# Altium footprint library SINA.PcbLib: 103 footprints (part 6 of 7)
Each footprint in its own frame and in the unit in brackets; x right, y up, seen from the top. Pads: shape width x height; smd on the part's side, far side on the other; paste and mask are expansions set on the pad; w line width, h text height; cw(c..) or ccw(c..) is an arc to the next point about the centre after c.
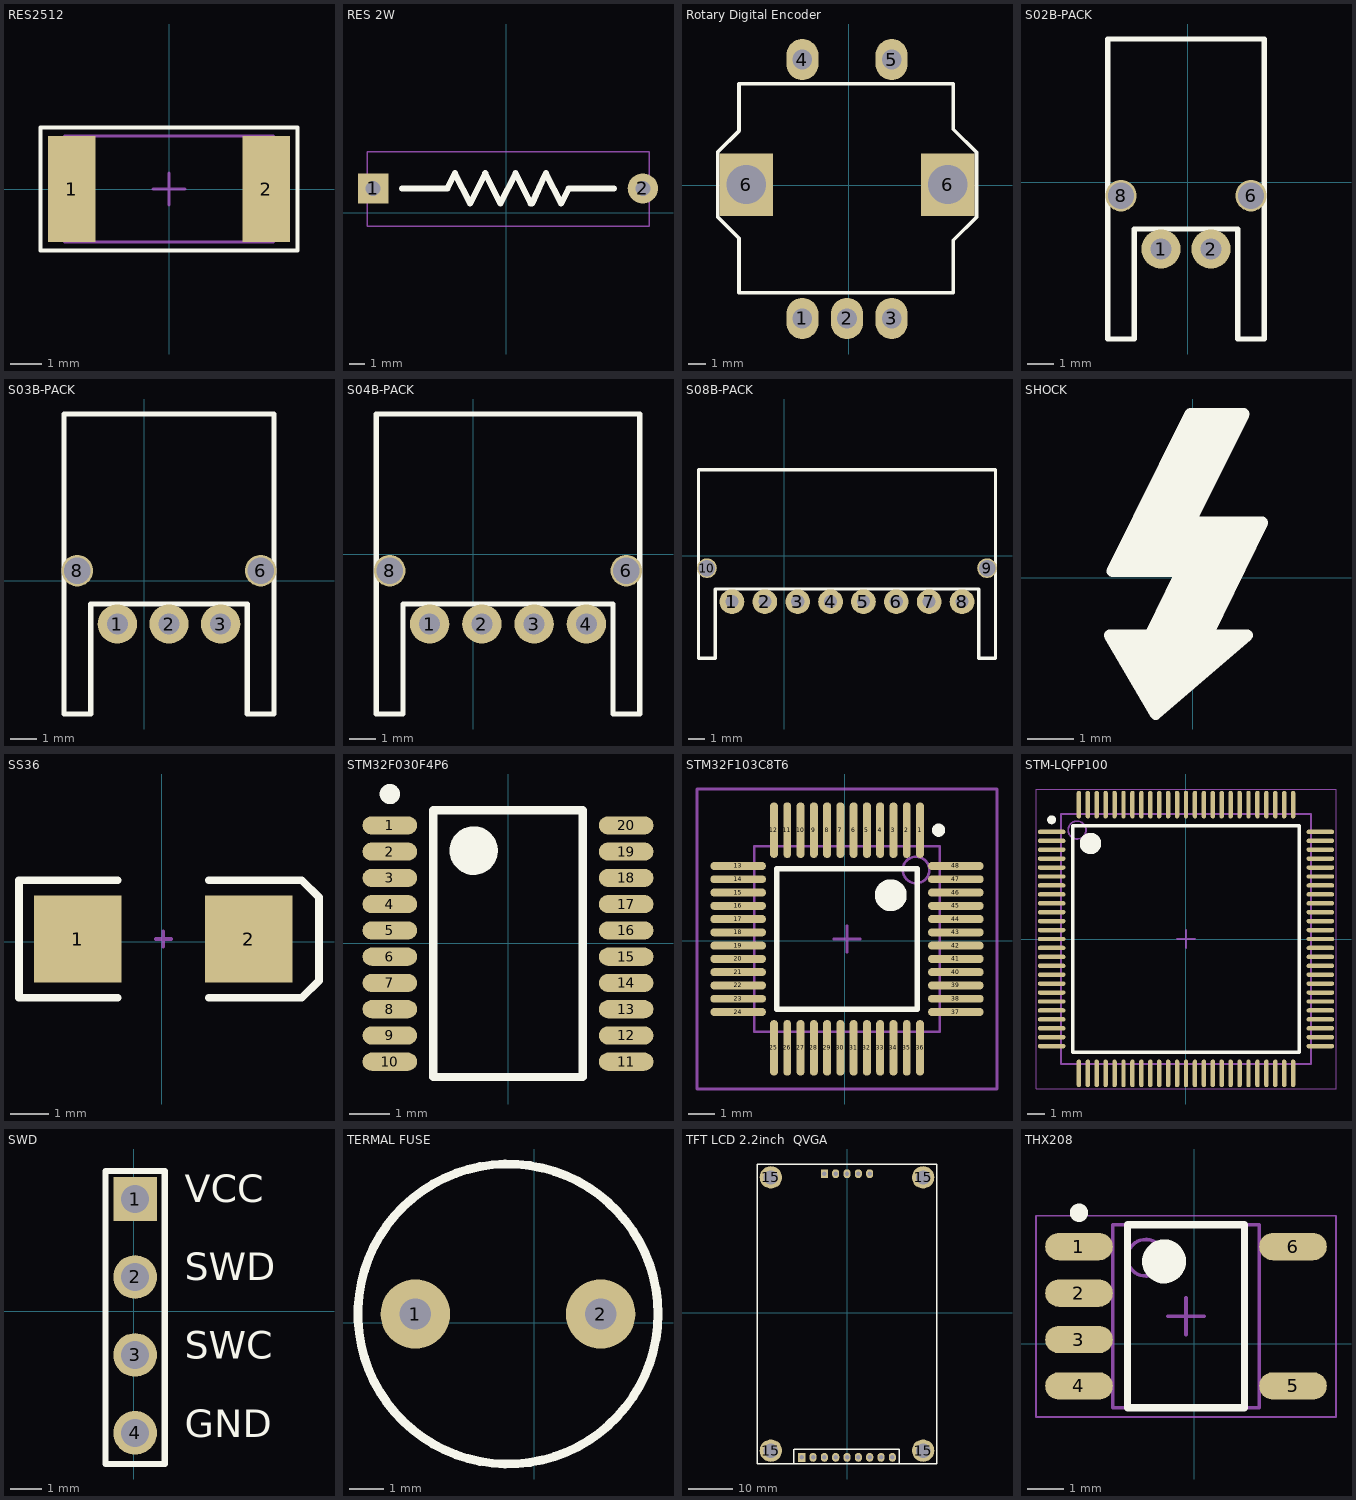
[diagram p5: the footprints below, top view; thin cyan lines are the x and y axes]

## RES2512 [mm]
pads (2):
  rect 1.5x3.35 smd: 1(-3.075,0) 2(3.075,0)
Top Overlay:
  lines w0.127: -4.064,-1.95 4.064,-1.95 4.064,1.95 -4.064,1.95 -4.064,-1.95
Mechanical 13:
  lines w0.1: -3.3,-1.675 3.3,-1.675 3.3,1.675 -3.3,1.675 -3.3,-1.675
Mechanical 15:
  lines w0.1: -0.5,0 0.5,0 ; 0,-0.5 0,0.5
3D body "Chip2PinSM127P600-8N.step": height 0.65, standoff 0, extent -3.3,-1.675 3.3,1.675

## RES 2W [mm]
pads (2):
  rect 2x2 hole 1: 1(-8.778,1.594)
  round 2 hole 1: 2(9.022,1.594)
Top Overlay:
  lines w0.406: -6.878,1.594 -3.878,1.594 -3.378,2.594 -2.378,0.594 -1.378,2.594 -0.378,0.594 0.622,2.594 1.622,0.594 ; 1.702,0.594 2.622,2.594 3.622,0.594 4.122,1.594 7.122,1.594
Mechanical 13:
  lines w0.1: -9.153,-0.906 -9.153,4.019 9.447,4.019 9.447,-0.906 -9.153,-0.906
3D body "Resistor_15R_to_Proteus.STEP": height 4.72, standoff -2.67, extent -9.096,-0.836 9.389,3.944

## Rotary Digital Encoder [mm]
pads (7):
  oval 1.8x2.3 hole 1.1: 1(-2.6,-7.45) 2(-0.1,-7.45) 3(2.4,-7.45) 4(-2.6,7.05) 5(2.4,7.05)
  rect 3x3.5 hole 2.2 square: 6(-5.75,0.05) 6(5.55,0.05)
Top Overlay:
  lines w0.2: -7.35,-1.75 -6.15,-2.95 -6.15,-6 5.85,-6 5.85,-3.075 7.15,-1.775 7.15,1.85 5.85,3.15 5.85,5.7 -6.15,5.7 -6.15,3.05 -7.35,1.85 -7.35,-1.75
3D body: height 3, standoff 0, extent -6.15,-6 5.85,5.7
3D body: height 6.5, standoff 3, extent -6.15,-6 5.85,5.7
3D body: height 18, standoff 6.5, extent -3.6,-3.497 3.4,3.497
3D body: height 28, standoff 11.5, extent -3.1,-3 2.9,3
3D body: height 4, standoff -3.5, extent 5.85,-0.973 6.45,1.074
3D body: height 4, standoff -3.5, extent -6.65,-0.973 -6.05,1.074
3D body: height 2.5, standoff -2.2, extent -2.843,6.807 -2.356,7.294
3D body: height 2.5, standoff 2, extent -2.862,5.6 -2.337,7.3
3D body: height 2.5, standoff -2.2, extent 2.157,6.807 2.644,7.294
3D body: height 2.5, standoff 2, extent 2.138,5.6 2.663,7.3
3D body: height 2.5, standoff -2.2, extent -2.844,-7.694 -2.356,-7.206
3D body: height 2.5, standoff 2, extent -2.862,-7.7 -2.338,-6
3D body: height 2.5, standoff -2.2, extent -0.344,-7.694 0.144,-7.206
3D body: height 2.5, standoff 2, extent -0.362,-7.7 0.162,-6
3D body: height 2.5, standoff -2.2, extent 2.156,-7.694 2.644,-7.206
3D body: height 2.5, standoff 2, extent 2.138,-7.7 2.662,-6

## S02B-PACK [mm]
pads (4):
  round 1.5 hole 0.8: 1(-1.016,-2.54) 2(0.889,-2.54)
  round 1.2 hole 1: 6(2.413,-0.508) 8(-2.54,-0.508)
Top Overlay:
  lines w0.2: -3.048,-5.969 -3.048,5.461 2.921,5.461 2.921,-5.969 1.905,-5.969 1.905,-1.778 -2.032,-1.778 -2.032,-5.969 -3.048,-5.969
3D body "S02B-PASK-2.STEP": height 6.5, standoff -3.4, extent -3.048,-6.049 2.952,5.651

## S03B-PACK [mm]
pads (5):
  round 1.5 hole 0.8: 1(-1.016,-1.651) 2(0.953,-1.651) 3(2.921,-1.651)
  round 1.2 hole 1: 6(4.445,0.381) 8(-2.54,0.381)
Top Overlay:
  lines w0.2: -3.048,-5.08 -2.032,-5.08 -2.032,-0.889 3.937,-0.889 3.937,-5.08 4.953,-5.08 4.953,6.35 -3.048,6.35 -3.048,-5.08
3D body "S03B-PASK-2.STEP": height 6.5, standoff -3.4, extent -3.048,-5.16 4.952,6.54

## S04B-PACK [mm]
pads (6):
  round 1.5 hole 0.8: 1(-1.651,-2.667) 2(0.339,-2.667) 3(2.328,-2.667) 4(4.318,-2.667)
  round 1.2 hole 1: 6(5.842,-0.635) 8(-3.175,-0.635)
Top Overlay:
  lines w0.2: -3.683,-6.096 -2.667,-6.096 -2.667,-1.905 5.334,-1.905 5.334,-6.096 6.35,-6.096 6.35,5.334 -3.683,5.334 -3.683,-6.096
3D body "S04B-PASK-2.STEP": height 6.5, standoff -3.4, extent -3.683,-6.176 6.317,5.524

## S08B-PACK [mm]
pads (10):
  round 1.5 hole 0.8: 1(-3.175,-2.794) 2(-1.179,-2.794) 3(0.816,-2.794) 4(2.812,-2.794) 5(4.808,-2.794) 6(6.804,-2.794) 7(8.799,-2.794) 8(10.795,-2.794)
  round 1.2 hole 1: 9(12.319,-0.762) 10(-4.699,-0.762)
Top Overlay:
  lines w0.2: -5.207,-6.223 -4.191,-6.223 -4.191,-2.032 11.811,-2.032 11.811,-6.223 12.827,-6.223 12.827,5.207 -5.207,5.207 -5.207,-6.223
3D body "S08B-PASK-2.STEP": height 6.5, standoff -3.4, extent -5.207,-6.303 12.793,5.397

## SHOCK [mm]
Top Overlay:
  region: -1.794,-1.24 -0.919,-1.24 -0.247,0.134 -0.247,0.14 -1.736,0.14 -0.05,3.535 1.1,3.535 -0.064,1.192 1.5,1.192 1.5,1.185 0.306,-1.24 1.175,-1.24 -0.8,-2.94
  lines w0.254: -0.925,-1.24 -1.794,-1.24 -0.8,-2.94 1.175,-1.24 0.306,-1.24 1.5,1.185 ; -0.919,-1.24 -0.247,0.134 ; -0.247,0.14 -1.736,0.14 -0.05,3.535 1.1,3.535 -0.064,1.192 1.5,1.192

## SS36 [mm]
pads (2):
  rect 2.3x2.3 smd: 1(-2.214,0.07) 2(2.286,0.07)
Top Overlay:
  lines w0.2: -1.164,-1.48 -3.764,-1.48 -3.764,1.62 -1.164,1.62 ; 1.236,-1.48 3.686,-1.48 4.136,-1.03 4.136,1.17 3.686,1.62 1.236,1.62
Mechanical 1:
  lines w0.1: -0.164,0.07 0.236,0.07 ; 0.036,-0.13 0.036,0.27
3D body: height 2, standoff 0, extent -2.504,-0.819 2.576,0.959

## STM32F030F4P6 [mm]
pads (20):
  oval 1.35x0.45 smd: 1(-2.933,2.915) 2(-2.933,2.264) 3(-2.933,1.615) 4(-2.933,0.964) 5(-2.933,0.315) 6(-2.933,-0.336) 7(-2.933,-0.985) 8(-2.933,-1.636) 9(-2.933,-2.285) 10(-2.933,-2.936) 11(2.917,-2.936) 12(2.917,-2.285) 13(2.917,-1.636) 14(2.917,-0.985) 15(2.917,-0.336) 16(2.917,0.315) 17(2.917,0.964) 18(2.917,1.615) 19(2.917,2.264) 20(2.917,2.915)
Top Overlay:
  circle w0.6: c-0.858,2.29 r0.3
  circle w0.25: c-2.933,3.689 r0.125
  lines w0.2: -1.858,-3.31 1.842,-3.31 1.842,3.29 -1.858,3.29 -1.858,-3.31
3D body: height 1.02, standoff 0, extent -1.905,-3.302 1.905,3.302

## STM32F103C8T6 [mm]
pads (48):
  oval 0.3x2.1 smd: 1(2.834,4.16) 2(2.334,4.16) 3(1.834,4.16) 4(1.334,4.16) 5(0.834,4.16) 6(0.334,4.16) 7(-0.166,4.16) 8(-0.666,4.16) 9(-1.166,4.16) 10(-1.666,4.16) 11(-2.166,4.16) 12(-2.666,4.16) 25(-2.666,-4.04) 26(-2.166,-4.04) 27(-1.666,-4.04) 28(-1.166,-4.04) 29(-0.666,-4.04) 30(-0.166,-4.04) 31(0.334,-4.04) 32(0.834,-4.04) 33(1.334,-4.04) 34(1.834,-4.04) 35(2.334,-4.04) 36(2.834,-4.04)
  oval 2.1x0.3 smd: 13(-4.016,2.81) 14(-4.016,2.31) 15(-4.016,1.81) 16(-4.016,1.31) 17(-4.016,0.81) 18(-4.016,0.31) 19(-4.016,-0.19) 20(-4.016,-0.69) 21(-4.016,-1.19) 22(-4.016,-1.69) 23(-4.016,-2.19) 24(-4.016,-2.69) 37(4.184,-2.69) 38(4.184,-2.19) 39(4.184,-1.69) 40(4.184,-1.19) 41(4.184,-0.69) 42(4.184,-0.19) 43(4.184,0.31) 44(4.184,0.81) 45(4.184,1.31) 46(4.184,1.81) 47(4.184,2.31) 48(4.184,2.81)
Top Overlay:
  circle w0.6: c1.734,1.71 r0.3
  circle w0.25: c3.534,4.16 r0.125
  lines w0.2: -2.566,-2.59 -2.566,2.71 2.734,2.71 2.734,-2.59 -2.566,-2.59
Mechanical 13:
  circle w0.1: c2.684,2.66 r0.5
  lines w0.1: -3.416,-3.44 -3.416,3.56 3.584,3.56 3.584,-3.44 -3.416,-3.44
Mechanical 15:
  lines w0.1: -0.416,0.06 0.584,0.06 ; 0.084,-0.44 0.084,0.56 ; -5.566,-5.59 -5.566,5.71 5.734,5.71 5.734,-5.59 -5.566,-5.59
3D body: height 1.6, standoff 0, extent -3.416,-3.44 3.584,3.56

## STM-LQFP100 [mm] "Thin QFP, 100-Leads, Body 14x14mm, Pitch 0.5mm, IPC High Density"
height 1.6
pads (100):
  oval 1.55x0.25 smd: 1(-7.525,6) 2(-7.525,5.5) 3(-7.525,5) 4(-7.525,4.5) 5(-7.525,4) 6(-7.525,3.5) 7(-7.525,3) 8(-7.525,2.5) 9(-7.525,2) 10(-7.525,1.5) 11(-7.525,1) 12(-7.525,0.5) 13(-7.525,0) 14(-7.525,-0.5) 15(-7.525,-1) 16(-7.525,-1.5) 17(-7.525,-2) 18(-7.525,-2.5) 19(-7.525,-3) 20(-7.525,-3.5) 21(-7.525,-4) 22(-7.525,-4.5) 23(-7.525,-5) 24(-7.525,-5.5) 25(-7.525,-6) 51(7.525,-6) 52(7.525,-5.5) 53(7.525,-5) 54(7.525,-4.5) 55(7.525,-4) 56(7.525,-3.5) 57(7.525,-3) 58(7.525,-2.5) 59(7.525,-2) 60(7.525,-1.5) 61(7.525,-1) 62(7.525,-0.5) 63(7.525,0) 64(7.525,0.5) 65(7.525,1) 66(7.525,1.5) 67(7.525,2) 68(7.525,2.5) 69(7.525,3) 70(7.525,3.5) 71(7.525,4) 72(7.525,4.5) 73(7.525,5) 74(7.525,5.5) 75(7.525,6)
  oval 0.25x1.55 smd: 26(-6,-7.525) 27(-5.5,-7.525) 28(-5,-7.525) 29(-4.5,-7.525) 30(-4,-7.525) 31(-3.5,-7.525) 32(-3,-7.525) 33(-2.5,-7.525) 34(-2,-7.525) 35(-1.5,-7.525) 36(-1,-7.525) 37(-0.5,-7.525) 38(0,-7.525) 39(0.5,-7.525) 40(1,-7.525) 41(1.5,-7.525) 42(2,-7.525) 43(2.5,-7.525) 44(3,-7.525) 45(3.5,-7.525) 46(4,-7.525) 47(4.5,-7.525) 48(5,-7.525) 49(5.5,-7.525) 50(6,-7.525) 76(6,7.525) 77(5.5,7.525) 78(5,7.525) 79(4.5,7.525) 80(4,7.525) 81(3.5,7.525) 82(3,7.525) 83(2.5,7.525) 84(2,7.525) 85(1.5,7.525) 86(1,7.525) 87(0.5,7.525) 88(0,7.525) 89(-0.5,7.525) 90(-1,7.525) 91(-1.5,7.525) 92(-2,7.525) 93(-2.5,7.525) 94(-3,7.525) 95(-3.5,7.525) 96(-4,7.525) 97(-4.5,7.525) 98(-5,7.525) 99(-5.5,7.525) 100(-6,7.525)
Top Overlay:
  circle w0.6: c-5.35,5.35 r0.3
  circle w0.25: c-7.525,6.675 r0.125
  lines w0.2: -6.35,-6.35 6.35,-6.35 6.35,6.35 -6.35,6.35 -6.35,-6.35
Mechanical 13:
  circle w0.1: c-6.1,6.1 r0.5
  lines w0.1: -7,-7 7,-7 7,7 -7,7 -7,-7
Mechanical 15:
  lines w0.05: -8.4,-8.4 8.4,-8.4 8.4,8.4 -8.4,8.4 -8.4,-8.4
  lines w0.1: -0.5,0 0.5,0 ; 0,-0.5 0,0.5
3D body: height 1.6, standoff 0.05, extent -7,-7 7,7

## SWD [mm]
pads (4):
  rect 1.4x1.4 hole 0.9: 1(0.05,3.6)
  round 1.4 hole 0.9: 2(0.05,1.1) 3(0.05,-1.4) 4(0.05,-3.9)
Top Overlay:
  lines w0.2: -0.9,-4.9 1,-4.9 1,4.5 -0.9,4.5 -0.9,-4.9
  text "VCC" at 1.65,3.2 h1.52
  text "GND" at 1.65,-4.35 h1.52
  text "SWC" at 1.65,-1.833 h1.52
  text "SWD" at 1.65,0.684 h1.52

## TERMAL FUSE [mm]
pads (2):
  round 2 hole 0.9: 1(-3.429,0.254) 2(1.905,0.254)
Top Overlay:
  circle w0.254: c-0.762,0.254 r4.318
3D body: height 0.25, standoff -3, extent -3.746,-0.063 -3.111,0.572
3D body: height 0.25, standoff -3, extent 1.588,-0.063 2.223,0.572
3D body: height 7.7, standoff 0, extent -4.962,-3.886 3.438,4.514

## TFT LCD 2.2inch  QVGA [mm]
pads (18):
  rect 1.6x2 hole 1: 1(-10.2,-32.4) 10(-5.13,31.12)
  oval 1.6x2 hole 1: 2(-7.661,-32.4) 3(-5.123,-32.4) 4(-2.584,-32.4) 5(-0.045,-32.4) 6(2.494,-32.4) 7(5.032,-32.4) 8(7.571,-32.4) 9(10.11,-32.4) 11(-2.591,31.12) 12(-0.053,31.12) 13(2.486,31.12) 14(5.025,31.12)
  round 5 hole 3.2: 15(-17.1,-30.9) 15(-17.1,30.3) 15(17,-30.9) 15(17,30.3)
Top Overlay:
  lines w0.3: -11.95,-33.9 -11.95,-30.6 ; -11.9,-30.6 11.7,-30.6 11.7,-33.9 ; -20.1,-33.9 -20.1,33.3 20,33.3 20,-33.9 -20.1,-33.9
3D body: height 15, standoff 12.5, extent -19.5,-26.85 19.15,26.7
3D body: height 15.2, standoff 12.5, extent -20.05,25.8 19.95,27.3
3D body: height 15.2, standoff 12.5, extent 18.45,-27.7 19.95,27.3
3D body: height 15.2, standoff 12.5, extent -20.05,-27.7 -18.55,27.3
3D body: height 15.2, standoff 12.5, extent -20.05,-27.7 -10.85,-26.2
3D body: height 15.2, standoff 12.5, extent 10.75,-27.7 19.95,-26.2
3D body: height 2, standoff -3, extent 15.512,28.803 18.5,31.797
3D body: height 2, standoff -3, extent -18.588,28.803 -15.6,31.797
3D body: height 2, standoff -3, extent -18.588,-32.397 -15.6,-29.403
3D body: height 2, standoff -3, extent 15.512,-32.397 18.5,-29.403
3D body: height 13, standoff 0, extent 15,-32.9 19,-28.9
3D body: height 13, standoff 0, extent -19.1,-32.9 -15.1,-28.9
3D body: height 13, standoff 0, extent -19.1,28.3 -15.1,32.3
3D body: height 13, standoff 0, extent 15,28.3 19,32.3
3D body: height 8.4, standoff 0, extent -6.869,29.9 6.55,32.4
3D body: height 8.4, standoff 0, extent -11.6,-33.55 11.4,-31.05
3D body: height 10.9, standoff 8.4, extent -6.869,29.9 6.55,32.4
3D body: height 15, standoff -3.3, extent 4.725,30.82 5.325,31.42
3D body: height 15, standoff -3.3, extent 2.186,30.82 2.786,31.42
3D body: height 15, standoff -3.3, extent -0.352,30.82 0.248,31.42
3D body: height 15, standoff -3.3, extent -2.891,30.82 -2.291,31.42
3D body: height 15, standoff -3.3, extent -5.43,30.82 -4.83,31.42
3D body: height 15, standoff -3.3, extent 9.81,-32.7 10.41,-32.1
3D body: height 15, standoff -3.3, extent 7.271,-32.7 7.871,-32.1
3D body: height 15, standoff -3.3, extent 4.733,-32.7 5.333,-32.1
3D body: height 15, standoff -3.3, extent 2.194,-32.7 2.794,-32.1
3D body: height 15, standoff -3.3, extent -0.345,-32.7 0.255,-32.1
3D body: height 15, standoff -3.3, extent -2.884,-32.7 -2.284,-32.1
3D body: height 15, standoff -3.3, extent -5.422,-32.7 -4.822,-32.1
3D body: height 15, standoff -3.3, extent -7.961,-32.7 -7.361,-32.1
3D body: height 15, standoff -3.3, extent -10.5,-32.7 -9.9,-32.1
3D body: height 10.9, standoff 8.4, extent -11.6,-33.55 11.4,-31.05
3D body: height 12.5, standoff 10.9, extent -20.1,-33.95 20,33.3
3D body: height 0.25, standoff 0, extent -7.4,-16.7 -7.4,-16.7
3D body: height 10.9, standoff 8.4, extent -19.9,-2.719 -2.9,23.25
3D body: height 14.5, standoff 12.5, extent -6.487,-29.4 6.588,-26.7

## THX208 [mm]
pads (6):
  oval 1.85x0.75 smd: 1(-3.15,2.659) 2(-3.15,1.389) 3(-3.15,0.119) 4(-3.15,-1.151) 5(2.7,-1.151) 6(2.7,2.659)
Top Overlay:
  circle w0.6: c-0.825,2.254 r0.3
  circle w0.25: c-3.15,3.584 r0.125
  lines w0.2: -1.825,-1.746 1.375,-1.746 1.375,3.254 -1.825,3.254 -1.825,-1.746
Mechanical 13:
  circle w0.1: c-1.325,2.354 r0.5
  lines w0.1: -2.225,-1.746 1.775,-1.746 1.775,3.254 -2.225,3.254 -2.225,-1.746
Mechanical 15:
  lines w0.05: -4.325,-1.996 3.875,-1.996 3.875,3.504 -4.325,3.504 -4.325,-1.996
  lines w0.1: -0.725,0.754 0.275,0.754 ; -0.225,0.254 -0.225,1.254
3D body "LM358.step": height 1.35, standoff 0, extent -3.475,-1.746 3.025,3.254